# Altium footprint library Module.PcbLib: 36 footprints (part 1 of 3)
Each footprint in its own frame and in the unit in brackets; x right, y up, seen from the top. Pads: shape width x height; smd on the part's side, far side on the other; paste and mask are expansions set on the pad; w line width, h text height; cw(c..) or ccw(c..) is an arc to the next point about the centre after c.
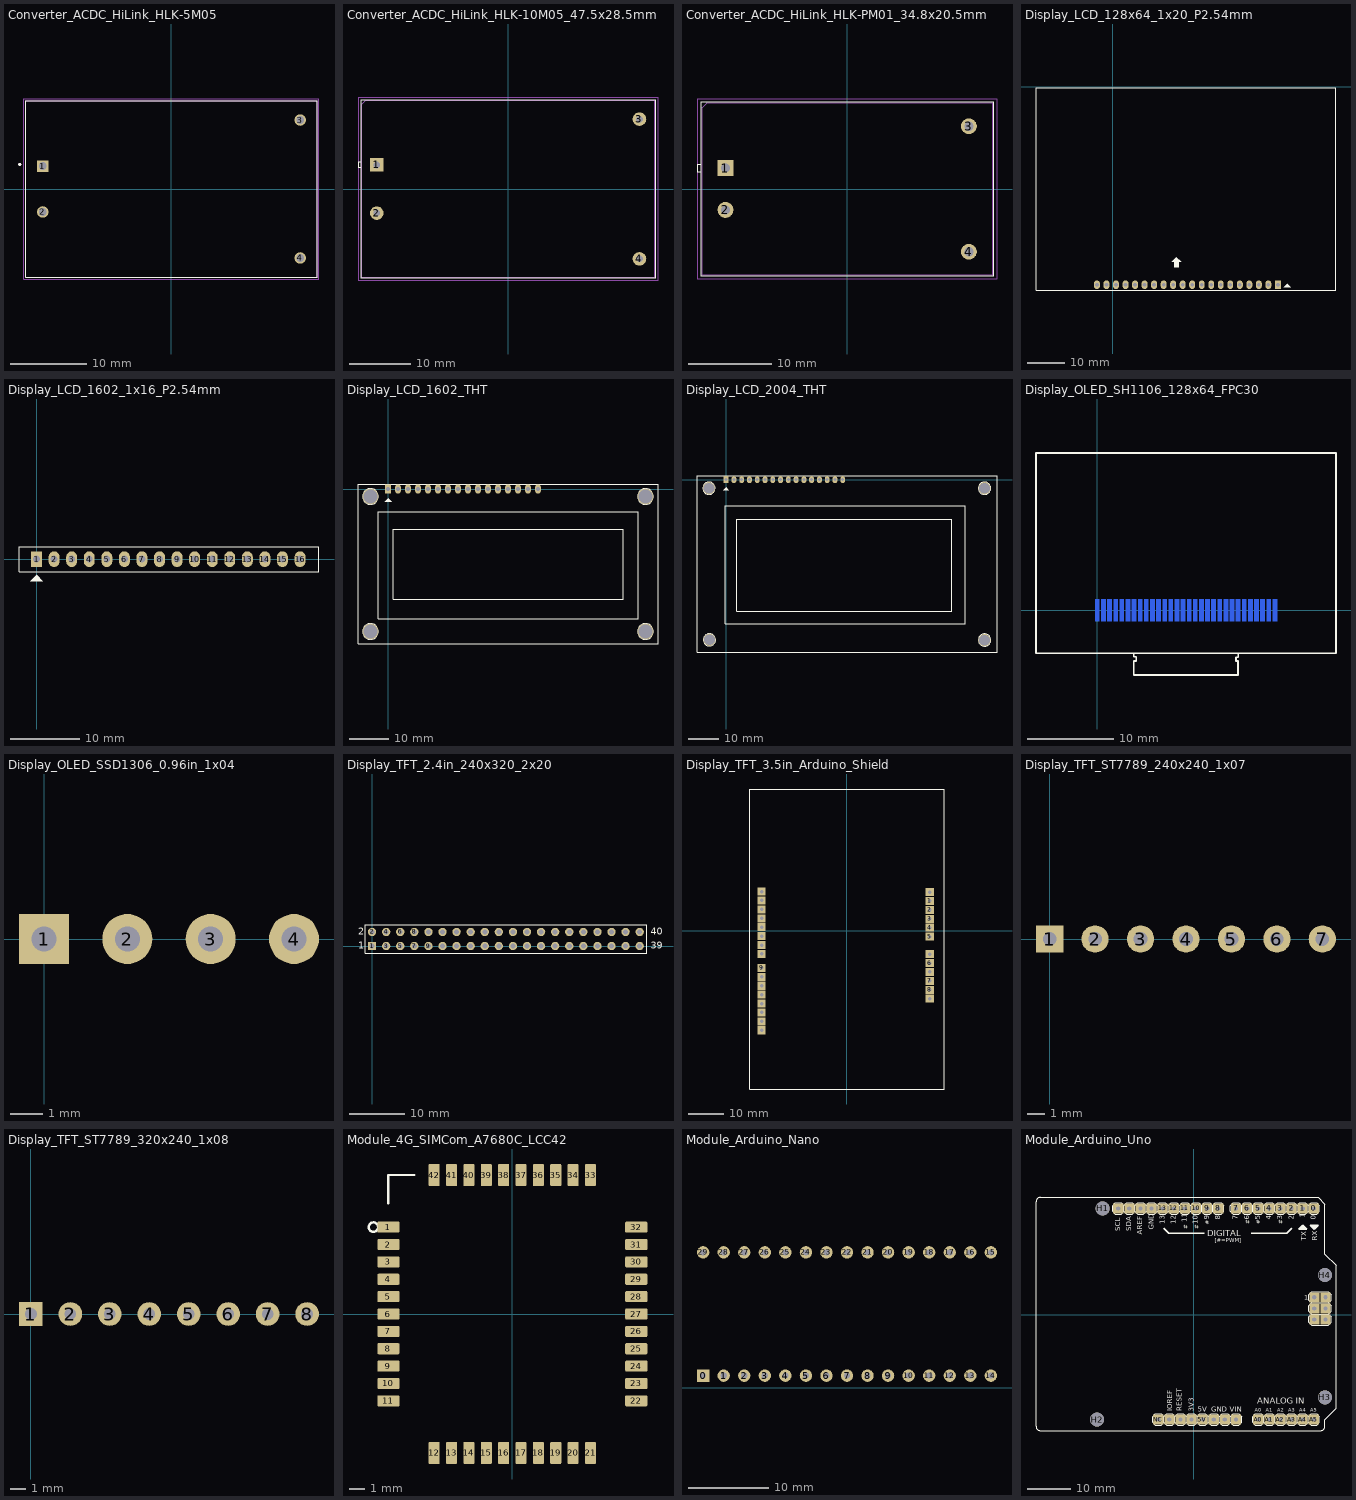
[diagram p0: the footprints below, top view; thin cyan lines are the x and y axes]

## Converter_ACDC_HiLink_HLK-5M05 [mm] "Hi-Link HLK-5M05 5V 5W AC-DC power module, 4 pins"
pads (4):
  rect 1.5x1.5 hole 1: 1(-16.8,3)
  round 1.5 hole 1: 2(-16.8,-3) 3(16.8,9) 4(16.8,-9)
Top Overlay:
  circle w0.2: c-19.8,3.2 r0.1
  lines w0.127: -19,-11.5 19,-11.5 19,11.5 -19,11.5 -19,-11.5
Mechanical 13:
  circle w0.2: c-19.8,3.2 r0.1
  lines w0.127: -19,-11.5 -19,11.5 19,11.5 19,-11.5 -19,-11.5
Mechanical 15:
  lines w0.05: -19.25,-11.75 -19.25,11.75 19.25,11.75 19.25,-11.75 -19.25,-11.75
3D body "HLK-5M05.stp": height 18.01, standoff -3.1, extent -19.077,-11.5 18.923,11.5

## Converter_ACDC_HiLink_HLK-10M05_47.5x28.5mm [mm] "HLK-10M05, Isolated AC/DC module, 5 V 2 A, 10 W — Mô-đun nguồn AC/DC cách ly 5 V 2 A, 10 W [Mo-dun nguon AC/DC cach ly 5 V 2 A, 10 W]"
height 22
pads (4):
  rect 2.2x2.2 hole 1.1: 1(-21.25,3.9)
  round 2.2 hole 1.1: 2(-21.25,-3.9) 3(21.25,11.3) 4(21.25,-11.3)
Top Overlay:
  lines w0.12: -23.87,3.48 -24.29,3.48 -24.29,4.32 -23.87,4.32 ; -23.87,-14.37 23.87,-14.37 23.87,14.37 -23.87,14.37 -23.87,-14.37
  text ".Designator" at -23.75,14.95 h1
Mechanical 2:
  lines w0.1: -23.75,-14.25 23.75,-14.25 23.75,14.25 -23.15,14.25 -23.75,13.65 -23.75,-14.25
Mechanical 4:
  lines w0.05: -24.25,-14.75 24.25,-14.75 24.25,14.75 -24.25,14.75 -24.25,-14.75
3D body "Converter_ACDC_HiLink_HLK-10M05_47.5x28.5mm.step": height 0, standoff 0, extent -22.35,-12.4 22.35,12.4

## Converter_ACDC_HiLink_HLK-PM01_34.8x20.5mm [mm] "HLK-PM01, Isolated AC/DC module, 5 V 600 mA, 3 W — Mô-đun nguồn AC/DC cách ly 5 V 600 mA, 3 W [Mo-dun nguon AC/DC cach ly 5 V 600 mA, 3 W]"
height 15
pads (4):
  rect 1.9x1.9 hole 1.1: 1(-14.54,2.5)
  round 1.9 hole 1.1: 2(-14.54,-2.5) 3(14.54,7.5) 4(14.54,-7.5)
Top Overlay:
  lines w0.12: -17.52,2.08 -17.94,2.08 -17.94,2.92 -17.52,2.92 ; -17.52,-10.37 17.52,-10.37 17.52,10.37 -17.52,10.37 -17.52,-10.37
  text ".Designator" at -17.4,10.95 h1
Mechanical 2:
  lines w0.1: -17.4,-10.25 17.4,-10.25 17.4,10.25 -16.8,10.25 -17.4,9.65 -17.4,-10.25
Mechanical 4:
  lines w0.05: -17.9,-10.75 17.9,-10.75 17.9,10.75 -17.9,10.75 -17.9,-10.75
3D body "Converter_ACDC_HiLink_HLK-PM01_34.8x20.5mm.step": height 0, standoff 0, extent -15.49,-8.45 15.49,8.45

## Display_LCD_128x64_1x20_P2.54mm [mil] "Graphic LCD 128x64 20-pin header footprint, pitch 2.54mm"
height 400
pads (20):
  rect 62x90 hole 39: 1(1735,-2080)
  oval 62x90 hole 39: 2(1635,-2080) 3(1535,-2080) 4(1435,-2080) 5(1335,-2080) 6(1235,-2080) 7(1135,-2080) 8(1035,-2080) 9(935,-2080) 10(835,-2080) 11(735,-2080) 12(635,-2080) 13(535,-2080) 14(435,-2080) 15(335,-2080) 16(235,-2080) 17(135,-2080) 18(35,-2080) 19(-65,-2080) 20(-165,-2080)
Top Overlay:
  region: 670,-1790 620,-1840 645,-1840 645,-1895 695,-1895 695,-1840 720,-1840
  region: 1832.5,-2072.5 1797.5,-2107.5 1867.5,-2107.5
  lines w8: -805,-2138 2345,-2138 2345,-12 -805,-12 -805,-2138
3D body "User Library-GRAPHIC LCD WG12864B.STEP": height 275.59, standoff -330.71, extent -804.61,-2137.98 2345,-12

## Display_LCD_1602_1x16_P2.54mm [mil] "Character LCD 16x2 16-pin header footprint, pitch 2.54mm"
height 400
pads (16):
  rect 62x90 hole 39: 1(0,0)
  oval 62x90 hole 39: 2(100,0) 3(200,0) 4(300,0) 5(400,0) 6(500,0) 7(600,0) 8(700,0) 9(800,0) 10(900,0) 11(1000,0) 12(1100,0) 13(1200,0) 14(1300,0) 15(1400,0) 16(1500,0)
Top Overlay:
  region: 0,-90 -35,-125 35,-125
  lines w7: -100,-71 -100,70 1608,70 1608,-71 -100,-71
3D body "socket16.stp": height 276.19, standoff -117.51, extent -49,-49 1551,51
3D body "jp16.stp": height 468.11, standoff -20.08, extent -48.03,-48.43 1548.03,50
3D body "lcd16.STEP": height 764, standoff 244, extent -319.64,-1353.49 2849.65,83.51

## Display_LCD_1602_THT [mil] "Character LCD 16x2 display module with mounting holes"
height 400
pads (20):
  rect 62x90 hole 36: 1(0,0)
  oval 62x90 hole 36: 2(100,0) 3(200,0) 4(300,0) 5(400,0) 6(500,0) 7(600,0) 8(700,0) 9(800,0) 10(900,0) 11(1000,0) 12(1100,0) 13(1200,0) 14(1300,0) 15(1400,0) 16(1500,0)
  round 157.48 hole 137.8: "Hole 0"(-175,-1425) "Hole 0"(-175,-75) "Hole 0"(2575,-1425) "Hole 0"(2575,-75)
Top Overlay:
  circle w7: c-175,-1425 r79.06
  circle w7: c-175,-75 r79.06
  circle w7: c2575,-75 r79.06
  circle w7: c2575,-1425 r79.06
  region: 0,-90 -35,-125 35,-125
  lines w7: -300,-1550 2700,-1550 2700,50 -300,50 -300,-1550 ; -100,-1300 2500,-1300 2500,-225 -100,-225 -100,-1300 ; 50,-1100 2350,-1100 2350,-400 50,-400 50,-1100
3D body "LCD module 16 X 2 backlight.STEP": height 414, standoff -106, extent -314.65,-1360 2854.65,77.01

## Display_LCD_2004_THT [mil] "Character LCD 20x4 display module with mounting holes"
height 400
pads (20):
  rect 62x90 hole 39: 1(0,0)
  oval 62x90 hole 39: 2(100,0) 3(200,0) 4(300,0) 5(400,0) 6(500,0) 7(600,0) 8(700,0) 9(800,0) 10(900,0) 11(1000,0) 12(1100,0) 13(1200,0) 14(1300,0) 15(1400,0) 16(1500,0)
  round 157.48 hole 137.8: "Hole 0"(-220,-110) "Hole 0"(-215,-2060) "Hole 0"(3325,-2065) "Hole 0"(3325,-110)
Top Overlay:
  circle w7: c3324.94,-2063 r79.06
  circle w7: c3324.94,-110 r79.06
  circle w7: c-221.06,-110 r79.06
  circle w7: c-215.06,-2061 r79.06
  region: 0,-100 -35,-135 35,-135
  lines w7: -375,-2220 -375,50 3485,50 3485,-2220 -374,-2220 ; -11,-1852 -11,-337 3076,-337 3076,-1852 -11,-1852 ; 139,-1695 139,-512 2905,-512 2905,-1695 139,-1695
3D body "User Library-LCD20_4.STEP": height 417.32, standoff -125.98, extent -392.13,-2264.2 3466.13,98

## Display_OLED_SH1106_128x64_FPC30 [mm] "OLED 128x64 SH1106 30-pin FPC display footprint, pitch 0.71mm"
pads (30):
  rect 0.5x2.5 smd far side: 1(0,0) 2(0.705,0) 3(1.41,0) 4(2.115,0) 5(2.82,0) 6(3.525,0) 7(4.23,0) 8(4.935,0) 9(5.641,0) 10(6.346,0) 11(7.051,0) 12(7.756,0) 13(8.461,0) 14(9.166,0) 15(9.871,0) 16(10.576,0) 17(11.281,0) 18(11.986,0) 19(12.691,0) 20(13.396,0) 21(14.101,0) 22(14.806,0) 23(15.512,0) 24(16.217,0) 25(16.922,0) 26(17.627,0) 27(18.332,0) 28(19.037,0) 29(19.742,0) 30(20.447,0)
Top Overlay:
  lines w0.2: 4.216,-4.953 4.191,-4.953 4.191,-5.359 4.496,-5.359 4.496,-5.842 4.191,-5.842 4.191,-7.442 16.205,-7.442 16.205,-5.842 15.977,-5.842 15.977,-5.436 15.977,-5.41 16.231,-5.41 16.231,-4.953 16.281,-4.953 ; -7.061,-4.953 27.483,-4.953 27.483,18.11 -7.061,18.11 -7.061,-4.953
3D body "Display_OLED_SH1106_128x64.step": height 1.65, standoff 0, extent -7.061,-7.442 27.483,18.11

## Display_OLED_SSD1306_0.96in_1x04 [mil] "0.96 inch OLED module SSD1306, 4-pin header, pitch 2.54mm"
pads (4):
  rect 60x60 hole 30: 1(0,0)
  round 60 hole 30: 2(100,0) 3(200,0) 4(300,0)
3D body "User Library-128x64I2COLEDDisplayAdafruit.STEP": height 357.98, standoff -69.02, extent -376.59,-93 674.59,1003.85

## Display_TFT_2.4in_240x320_2x20 [mm] "2.4 inch TFT LCD 240x320 2x20 header, pitch 2.54mm"
height 1.14
pads (40):
  rect 1.5x1.5 hole 0.9: 1(0,0)
  round 1.5 hole 0.9: 2(0,2.54) 3(2.54,0) 4(2.54,2.54) 5(5.08,0) 6(5.08,2.54) 7(7.62,0) 8(7.62,2.54) 9(10.16,0) 10(10.16,2.54) 11(12.7,0) 12(12.7,2.54) 13(15.24,0) 14(15.24,2.54) 15(17.78,0) 16(17.78,2.54) 17(20.32,0) 18(20.32,2.54) 19(22.86,0) 20(22.86,2.54) 21(25.4,0) 22(25.4,2.54) 23(27.94,0) 24(27.94,2.54) 25(30.48,0) 26(30.48,2.54) 27(33.02,0) 28(33.02,2.54) 29(35.56,0) 30(35.56,2.54) 31(38.1,0) 32(38.1,2.54) 33(40.64,0) 34(40.64,2.54) 35(43.18,0) 36(43.18,2.54) 37(45.72,0) 38(45.72,2.54) 39(48.26,0) 40(48.26,2.54)
Top Overlay:
  lines w0.2: -1.27,-1.27 -1.27,3.81 49.53,3.81 49.53,-1.27 -1.27,-1.27
  text "39" at 50.292,-0.508 h1.27
  text "40" at 50.292,2.032 h1.27
  text "2" at -2.54,2.032 h1.27
  text "1" at -2.54,-0.508 h1.27
3D body "User Library-TFT 3_2 with touch screen.STEP": height 6.02, standoff -8.42, extent -7.881,-89.489 56.119,4.511

## Display_TFT_3.5in_Arduino_Shield [mm] "3.5 inch TFT LCD 8-bit Arduino Uno shield footprint"
pads (28):
  rect 2.3x2.3 hole 1: 1(23.746,8.434) 2(23.746,5.894) 3(23.746,3.354) 4(23.746,0.814) 5(23.746,-1.726) 6(23.746,-9.286) 7(23.746,-14.366) 8(23.746,-16.906) 9(-24.254,-10.666) 10(-24.254,-13.206) 11(-24.254,6.034) 12(-24.254,3.494) 13(-24.254,0.954) 14(-24.254,-1.586) 15(-24.254,-4.126) 16(-24.254,-6.666) 17(-24.254,-15.746) 18(-24.254,-18.286) 19(-24.254,-20.826) 20(-24.254,-23.366) AREF(-24.254,-28.446) GND(23.746,-11.826) GND3(-24.254,-25.906) NC(-24.254,8.574) NC(-24.254,11.114) RESET(23.746,-19.446) RESET(23.746,10.974) Vin(23.746,-6.746)
Top Overlay:
  lines w0.254: -27.686,-45.212 27.94,-45.212 27.94,40.386 -27.686,40.386 -27.686,-45.212
3D body "3.5TFT.STEP": height 14.53, standoff -0.31, extent -27.813,-45.318 27.817,40.492

## Display_TFT_ST7789_240x240_1x07 [mil] "TFT LCD module ST7789 240x240, 7-pin header, pitch 2.54mm"
pads (7):
  rect 60x60 hole 30: 1(0,0)
  round 60 hole 30: 2(100,0) 3(200,0) 4(300,0) 5(400,0) 6(500,0) 7(600,0)
3D body "1.3 TFT IPS - Module.stp": height 320.29, standoff 160.63, extent -251,-1489 849,61

## Display_TFT_ST7789_320x240_1x08 [mil] "TFT LCD module ST7789 320x240, 8-pin header, pitch 2.54mm"
pads (8):
  rect 60x60 hole 30: 1(0,0)
  round 60 hole 30: 2(100,0) 3(200,0) 4(300,0) 5(400,0) 6(500,0) 7(600,0) 8(700,0)
3D body "2.0 TFT IPS - Module.stp": height 357.25, standoff 125.98, extent -369.5,-2348 1067.5,60

## Module_4G_SIMCom_A7680C_LCC42 [mm] "SIMCom A7680C 4G LTE Cat.1 wireless module, 15.7x17.6mm LCC-42"
height 2.4
pads (42):
  rrect20% 1.4x0.7 smd: 1(-7.85,5.5) 2(-7.85,4.4) 3(-7.85,3.3) 4(-7.85,2.2) 5(-7.85,1.1) 6(-7.85,0) 7(-7.85,-1.1) 8(-7.85,-2.2) 9(-7.85,-3.3) 10(-7.85,-4.4) 11(-7.85,-5.5) 22(7.85,-5.5) 23(7.85,-4.4) 24(7.85,-3.3) 25(7.85,-2.2) 26(7.85,-1.1) 27(7.85,0) 28(7.85,1.1) 29(7.85,2.2) 30(7.85,3.3) 31(7.85,4.4) 32(7.85,5.5)
  rrect20% 0.7x1.4 smd: 12(-4.95,-8.8) 13(-3.85,-8.8) 14(-2.75,-8.8) 15(-1.65,-8.8) 16(-0.55,-8.8) 17(0.55,-8.8) 18(1.65,-8.8) 19(2.75,-8.8) 20(3.85,-8.8) 21(4.95,-8.8) 33(4.95,8.8) 34(3.85,8.8) 35(2.75,8.8) 36(1.65,8.8) 37(0.55,8.8) 38(-0.55,8.8) 39(-1.65,8.8) 40(-2.75,8.8) 41(-3.85,8.8) 42(-4.95,8.8)
Top Overlay:
  circle w0.15: c-8.8,5.5 r0.3
  lines w0.15: -7.85,7 -7.85,8.8 -6.2,8.8
3D body "SIMCom_A7680C.step": height 3, standoff 0, extent -7.85,-8.8 7.85,8.8

## Module_Arduino_Nano [mil] "Arduino Nano board footprint, 30 pins, pitch 2.54mm"
height 1700
pads (30):
  rect 60x60 hole 30: 0(160,60)
  round 60 hole 30: 1(260,60) 2(360,60) 3(460,60) 4(560,60) 5(660,60) 6(760,60) 7(860,60) 8(960,60) 9(1060,60) 10(1160,60) 11(1260,60) 12(1360,60) 13(1460,60) 14(1560,60) 15(1560,660) 16(1460,660) 17(1360,660) 18(1260,660) 19(1160,660) 20(1060,660) 21(960,660) 22(860,660) 23(760,660) 24(660,660) 25(560,660) 26(460,660) 27(360,660) 28(260,660) 29(160,660)
3D body "Arduino_NANO_CH340.step": height 507.32, standoff -49.21, extent -25,10 1714.76,710

## Module_Arduino_Uno [mm] "Arduino Uno board footprint, 42 pins"
pads (42):
  rect 2.3x2.3 hole 1: 0(27.44,24.26) 1(24.9,24.26) 2(22.36,24.26) 3(19.82,24.26) 3V3(-0.5,-24) 4(17.28,24.26) 5(14.74,24.26) 5V(2.04,-24) 6(12.2,24.26) 7(9.66,24.26) 8(5.596,24.26) 9(3.056,24.26) 10(0.516,24.26) 11(-2.024,24.26) 12(-4.564,24.26) 13(-7.104,24.26) A0(14.74,-24) A1(17.28,-24) A2(19.82,-24) A3(22.36,-24) A4(24.9,-24) A5(27.44,-24) AREF(-12.184,24.26) GND1(4.58,-24) GND2(7.12,-24) GND3(-9.644,24.26) ICSP1(27.567,3.94) ICSP2(30.107,3.94) ICSP3(27.567,1.4) ICSP4(30.107,1.4) ICSP5(27.567,-1.14) ICSP6(30.107,-1.14) IOREF(-5.58,-24) NC(-8.12,-24) RESET(-3.04,-24) SCL(-17.264,24.26) SDA(-14.724,24.26) Vin(9.66,-24)
  round 3.2 hole 3.2: H1(-20.82,24.26) H2(-22.09,-24) H3(29.98,-18.92) H4(29.98,9.02)
Bottom Layer:
  lines w0.305: -14.724,24.26 -14.47,24.26
Top Overlay:
  drawing of 281 lines, arcs and shapes, not listed
  text "SDA" at -14.271,19.087 h1.21
  text "SCL" at -16.8,19.1 h1.21
  text "#" at 3.6,20.5 h0.95
  text "#" at 12.8,20.6 h0.95
  text "#" at 20.3,20.6 h0.95
  text "#" at 15.2,20.6 h0.95
  text "#" at 1.1,19.5 h0.95
  text "#" at -1.4,19.5 h0.95
  text "[#=PWM]" at 4.834,16.513 h0.95
  text "0" at 27.887,21.676 h1.21
  text "1" at 25.347,22.079 h1.21
  text "2" at 22.807,21.676 h1.21
  text "3" at 20.267,21.676 h1.21
  text "4" at 17.727,21.676 h1.21
  text "5" at 15.187,21.676 h1.21
  text "6" at 12.647,21.676 h1.21
  text "7" at 10.107,21.676 h1.21
  text "8" at 6.043,21.676 h1.21
  text "9" at 3.503,21.676 h1.21
  text "10" at 0.963,20.669 h1.21
  text "11" at -1.577,21.072 h1.21
  text "12" at -4.117,20.669 h1.21
  text "13" at -6.657,20.669 h1.21
  text "RX" at 28.202,16.894 h1.21
  text "TX" at 25.662,16.919 h1.21
  text "DIGITAL" at 3.107,17.885 h1.42
  text "IOREF" at -4.945,-22.095 h1.21
  text "GND" at 3.97,-22.222 h1.21
  text "VIN" at 8.263,-22.222 h1.21
  text "A5" at 26.653,-22.197 h0.86
  text "A4" at 24.113,-22.197 h0.86
  text "A3" at 21.573,-22.197 h0.86
  text "A2" at 19.033,-22.197 h0.86
  text "A1" at 16.493,-22.197 h0.86
  text "3V3" at 0.008,-22.222 h1.21
  text "RESET" at -2.786,-22.095 h1.21
  text "GND" at -9.172,19.386 h1.21
  text "1" at 25.205,3.407 h1.08
  text "AREF" at -11.814,18.203 h1.21
  text "ANALOG IN" at 14.486,-20.444 h1.42
  text "A0" at 13.953,-22.197 h0.86
  text "5V" at 0.897,-22.222 h1.21
3D body "Module_Arduino_Uno.step": height 3.6, standoff -2.5, extent -36.06,-27.1 32.52,27.36